# Altium footprint library PCB_Module.PcbLib: 16 footprints
Each footprint in its own frame and in the unit in brackets; x right, y up, seen from the top. Pads: shape width x height; smd on the part's side, far side on the other; paste and mask are expansions set on the pad; w line width, h text height; cw(c..) or ccw(c..) is an arc to the next point about the centre after c.
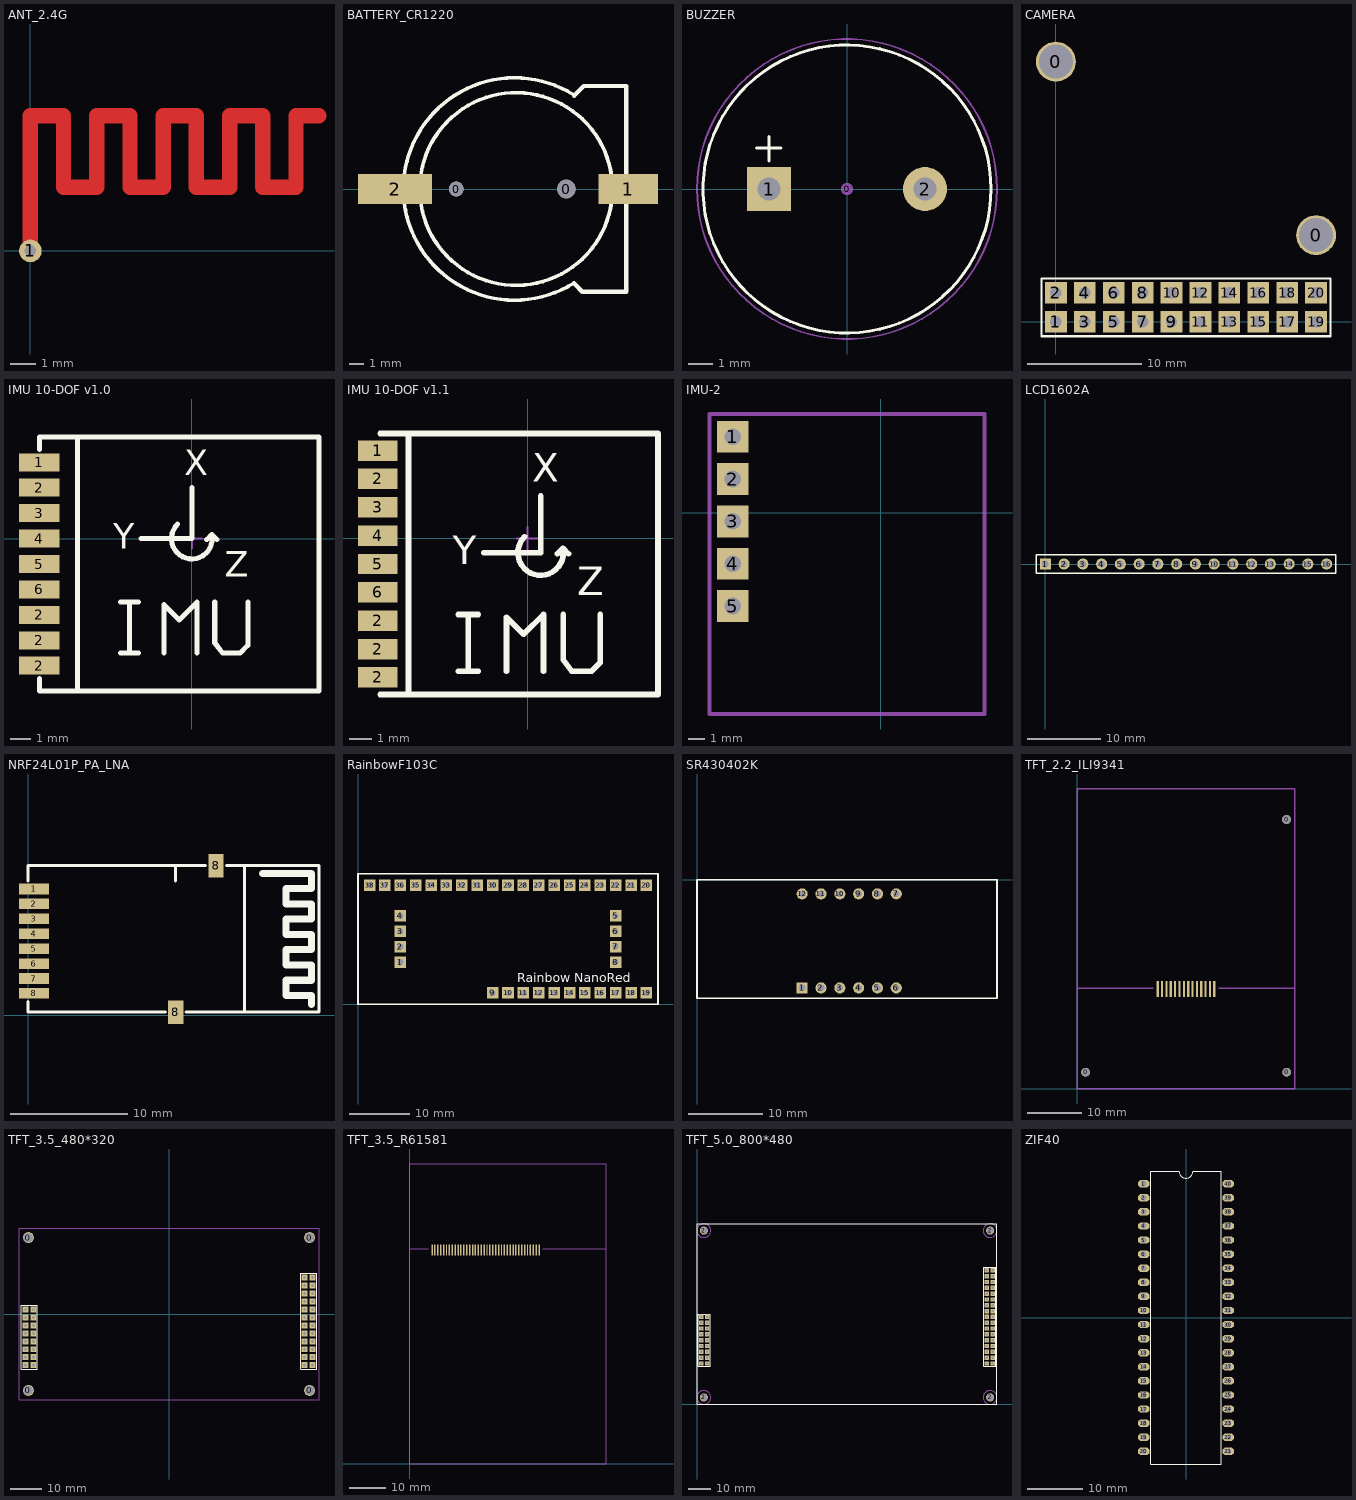
[diagram p0: the footprints below, top view; thin cyan lines are the x and y axes]

## ANT_2.4G [mil]
pads (1):
  round 35 hole 18: 1(0,0)
Top Layer:
  lines w23.62: 0,3.51 0,208.24 51.18,208.24 51.18,98 102.36,98 102.36,208.24 153.54,208.24 153.54,98 204.72,98 204.72,208.24 255.91,208.24 255.91,98 307.09,98 307.09,208.24 358.27,208.24 358.27,98 409.45,98 409.45,208.24 444.88,208.24

## BATTERY_CR1220 [mil]
pads (4):
  round 40 hole 40: 0(342.52,0)
  round 50 hole 50: 0(640,0)
  rect 160x80 smd: 1(807.09,0)
  rect 200x80 smd: 2(177.16,0)
Top Overlay:
  circle w10: c503.94,0 r260.11
  lines w10: 659.93,254.01 ccw(c500,0) 660.14,-253.88
  lines w12: 660.45,251.97 686.52,278.04 801.66,278.04 801.66,0 801.66,-277.07 682.59,-277.07 661.42,-255.91
3D body: height 158.08, standoff -36.4, extent 135.75,-295.69 864.09,294.73

## BUZZER [mil]
height 354.33
pads (3):
  round 20 on Mech14: 0(0,0)
  rect 72x72 / inner rect 72x72 / far side rect 90x90 hole 38: 1(-127.95,0)
  round 72 / inner round 72 / far side round 90 hole 38: 2(127.95,0)
Top Overlay:
  circle w5: c0,0 r236.22
  lines w5: -148.27,66.93 -108.27,66.93 ; -128.02,45.87 -128.02,85.87
Mechanical 13:
  circle w3: c0.14,-0.47 r236.22
Mechanical 14:
  circle w3: c0,0 r246.06
3D body: height 50, standoff 0, extent -172.59,-44.91 -82.95,44.92
3D body: height 50, standoff 0, extent 83.31,-44.9 172.96,44.92
3D body: height 354.33, standoff -110.24, extent -246.02,-246.04 246.07,246.06

## CAMERA [mm] "Connector; Header; 2x2 Position"
height 4.3
pads (22):
  round 3.5 hole 3: 0(0,22.86) 0(22.86,7.62)
  rect 1.905x1.905 hole 1: 1(0,0) 2(0,2.54) 3(2.54,0) 4(2.54,2.54) 5(5.08,0) 6(5.08,2.54) 7(7.62,0) 8(7.62,2.54) 9(10.16,0) 10(10.16,2.54) 11(12.7,0) 12(12.7,2.54) 13(15.24,0) 14(15.24,2.54) 15(17.78,0) 16(17.78,2.54) 17(20.32,0) 18(20.32,2.54) 19(22.86,0) 20(22.86,2.54)
Top Overlay:
  lines w0.2: -1.27,-1.27 24.13,-1.27 24.13,3.81 -1.27,3.81 -1.27,-1.27
3D body: height 8.5, standoff -3.2, extent -1.395,-1.23 3.935,3.77
3D body: height 8.5, standoff -3.2, extent 3.685,-1.23 11.555,3.77
3D body: height 8.5, standoff -3.2, extent 16.385,-1.23 24.255,3.77
3D body: height 8.5, standoff -3.2, extent 11.305,-1.23 16.635,3.77

## IMU 10-DOF v1.0 [mil]
pads (9):
  rect 80x35.43 smd: 1(-300,150) 2(-300,-250) 2(-300,-200) 2(-300,-150) 2(-300,100) 3(-300,50) 4(-300,0) 5(-300,-50) 6(-300,-100)
Top Overlay:
  lines w10: -300,-275 -300,-300 250,-300 250,200 -300,200 -300,175 ; -225,-300 -225,200 ; -140,-225 -105,-225 ; -140,-125 -105,-125 ; -122.5,-225 -122.5,-125 ; -100,0 0,0 0,100 ; -55,-225 -55,-130 -25,-160 10,-125 10,-225 ; -28.28,28.28 ccw(c0,0) 39.22,7.84 ; 29.22,-2.16 39.22,7.84 ; 45,-125 45,-205 60,-225 95,-225 110,-210 110,-125 ; 49.22,-2.16 39.22,7.84
  text "Z" at 65,-75 h50
  text "Y" at -155,-20 h50
  text "X" at -15,125 h50
Mechanical 15:
  lines w3.94: -19.68,0 19.69,0 -19.69,0 ; 0,-19.68 0,19.69 0,-19.69
3D body: height 75.06, standoff 0.6, extent -300,-300 250,200

## IMU 10-DOF v1.1 [mil]
pads (9):
  rect 70x36 smd: 1(-264,155) 2(-264,-245) 2(-264,-195) 2(-264,-145) 2(-264,105) 3(-264,55) 4(-264,5) 5(-264,-45) 6(-264,-95)
Top Overlay:
  lines w10: -260,-275 230,-275 230,185 -260,185 ; -210,-275 -210,185 ; -122,-234 -87,-234 ; -122,-134 -87,-134 ; -104.5,-234 -104.5,-134 ; -77,-25 23,-25 23,75 ; -37,-234 -37,-139 -7,-169 28,-134 28,-234 ; -5.28,3.28 ccw(c23,-25) 62.22,-17.16 ; 52.22,-27.16 62.22,-17.16 ; 63,-134 63,-214 78,-234 113,-234 128,-219 128,-134 ; 72.22,-27.16 62.22,-17.16
  text "Z" at 88,-100 h50
  text "Y" at -132,-45 h50
  text "X" at 8,100 h50
Mechanical 15:
  lines w3.94: -19.69,0 19.68,0 ; 0,-19.69 0,19.68
3D body: height 75.06, standoff 0.6, extent -299.99,-275 230.01,185

## IMU-2 [mil]
pads (5):
  rect 75x75 hole 39.37: 1(-350,180) 2(-350,80) 3(-350,-20) 4(-350,-120) 5(-350,-220)
Mechanical 13:
  lines w10: -405,-475 244.61,-475 244.61,233.66 -405,233.66 -405,-475

## LCD1602A [mm] "LCD1602AҺ"
pads (16):
  rect 1.5x1.5 hole 0.9: 1(0,0)
  round 1.5 hole 0.9: 2(2.54,0) 3(5.08,0) 4(7.62,0) 5(10.16,0) 6(12.7,0) 7(15.24,0) 8(17.78,0) 9(20.32,0) 10(22.86,0) 11(25.4,0) 12(27.94,0) 13(30.48,0) 14(33.02,0) 15(35.56,0) 16(38.1,0)
Top Overlay:
  lines w0.2: -1.27,-1.27 39.37,-1.27 39.37,1.27 0.635,1.27 -1.27,1.27 -1.27,-1.27
3D body: height 21.34, standoff -2.98, extent -8,-34.5 72.5,2

## NRF24L01P_PA_LNA [mm]
pads (10):
  rect 2.54x0.9 smd: 1(0.504,10.734) 2(0.504,9.464) 3(0.504,8.194) 4(0.504,6.924) 5(0.504,5.654) 6(0.504,4.384) 7(0.504,3.114) 8(0.504,1.844)
  rect 1.3x2 smd: 8(12.573,0.254) 8(16.002,12.7)
Top Overlay:
  lines w0.254: 0,1.143 0,0.254 11.684,0.254 ; 0,11.43 0,12.719 15.113,12.719 ; 12.569,11.43 12.569,12.719 ; 13.462,0.254 24.765,0.254 24.765,12.719 16.891,12.719 ; 18.413,0.254 18.413,12.719
  lines w0.6: 19.939,12.065 24.115,12.065 24.115,10.765 21.971,10.765 21.971,9.465 24.115,9.465 24.115,8.165 21.971,8.165 21.971,6.865 24.115,6.865 24.115,5.565 21.971,5.565 21.971,4.265 24.115,4.265 24.115,2.965 21.971,2.965 21.971,1.665 24.115,1.665 24.115,0.889

## RainbowF103C [mm]
pads (38):
  rect 1.905x1.905 hole 1: 1(6.985,6.985) 2(6.985,9.525) 3(6.985,12.065) 4(6.985,14.605) 5(42.545,14.605) 6(42.545,12.065) 7(42.545,9.525) 8(42.545,6.985) 9(22.225,1.905) 10(24.765,1.905) 11(27.305,1.905) 12(29.845,1.905) 13(32.385,1.905) 14(34.925,1.905) 15(37.465,1.905) 16(40.005,1.905) 17(42.545,1.905) 18(45.085,1.905) 19(47.625,1.905) 20(47.625,19.685) 21(45.085,19.685) 22(42.545,19.685) 23(40.005,19.685) 24(37.465,19.685) 25(34.925,19.685) 26(32.385,19.685) 27(29.845,19.685) 28(27.305,19.685) 29(24.765,19.685) 30(22.225,19.685) 31(19.685,19.685) 32(17.145,19.685) 33(14.605,19.685) 34(12.065,19.685) 35(9.525,19.685) 36(6.985,19.685) 37(4.445,19.685) 38(1.905,19.685)
Top Overlay:
  lines w0.254: 0,0 0,21.59 49.53,21.59 49.53,0 0,0
  text "Rainbow NanoRed" at 26.264,3.683 h1.52
3D body: height 4.97, standoff -8.01, extent -2.912,0 52.442,21.59

## SR430402K [mm]
pads (12):
  rect 1.5x1.5 hole 0.9: 1(14.2,-14.6)
  round 1.5 hole 0.9: 2(16.74,-14.6) 3(19.28,-14.6) 4(21.82,-14.6) 5(24.36,-14.6) 6(26.9,-14.6) 7(26.9,-1.9) 8(24.36,-1.9) 9(21.82,-1.9) 10(19.28,-1.9) 11(16.74,-1.9) 12(14.2,-1.9)
Top Overlay:
  lines w0.203: 0,-16 0,0 40.5,0 40.5,-16 0,-16
3D body: height 7, standoff -1.1, extent 0.129,-15.975 40.309,0.025

## TFT_2.2_ILI9341 [mm]
pads (17):
  round 1.6 hole 1.6 unplated: 0(1.575,3.099) 0(38.557,49.581) 0(38.583,3.099)
  rect 0.4x3 smd: 1(14.856,18.39) 2(15.656,18.39) 3(16.456,18.39) 4(17.256,18.39) 5(18.056,18.39) 6(18.856,18.39) 7(19.656,18.39) 8(20.456,18.39) 9(21.256,18.39) 10(22.056,18.39) 11(22.856,18.39) 12(23.656,18.39) 13(24.456,18.39) 14(25.256,18.39)
Mechanical 13:
  lines w0.254: 0,18.5 14.021,18.5 ; 26.035,18.5 40.056,18.5 ; 0,0 0,55.2 40.1,55.2 40.1,0 0,0

## TFT_3.5_480*320 [mm]
pads (44):
  round 3.5 hole 3: 0(-44.772,-24.332) 0(-44.772,24.332) 0(44.772,-24.332) 0(44.772,24.332)
  rect 1.905x1.905 hole 1: 1(43.18,11.632) 2(45.72,11.632) 3(43.18,9.092) 4(45.72,9.092) 5(43.18,6.552) 6(45.72,6.552) 7(43.18,4.012) 8(45.72,4.012) 9(43.18,1.472) 10(45.72,1.472) 11(43.18,-1.068) 12(45.72,-1.068) 13(43.18,-3.608) 14(45.72,-3.608) 15(43.18,-6.148) 16(45.72,-6.148) 17(43.18,-8.688) 18(45.72,-8.688) 19(43.18,-11.228) 20(45.72,-11.228) 21(43.18,-13.768) 22(45.72,-13.768) 23(43.18,-16.308) 24(45.72,-16.308) 25(-45.72,1.472) 26(-43.18,1.472) 27(-45.72,-1.068) 28(-43.18,-1.068) 29(-45.72,-3.608) 30(-43.18,-3.608) 31(-45.72,-6.148) 32(-43.18,-6.148) 33(-45.72,-8.688) 34(-43.18,-8.688) 35(-45.72,-11.228) 36(-43.18,-11.228) 37(-45.72,-13.768) 38(-43.18,-13.768) 39(-45.72,-16.308) 40(-43.18,-16.308)
Top Overlay:
  lines w0.254: -46.99,-17.578 -46.99,2.742 -41.91,2.742 -41.91,-17.578 -46.99,-17.578 ; 41.91,-17.578 46.99,-17.578 46.99,12.902 41.91,12.902 41.91,-17.578
Mechanical 13:
  lines w0.051: -47.772,-27.332 47.772,-27.332 47.772,27.332 -47.772,27.332 -47.772,-27.332
3D body: height 7.58, standoff -2.94, extent -46.99,-17.578 -44.45,-15.038
3D body: height 7.58, standoff -2.94, extent -44.45,-17.578 -41.91,-15.038
3D body: height 7.58, standoff -2.94, extent -44.45,0.202 -41.91,2.742
3D body: height 7.58, standoff -2.94, extent -46.99,0.202 -44.45,2.742
3D body: height 7.58, standoff -2.94, extent -46.99,-2.338 -44.45,0.202
3D body: height 7.58, standoff -2.94, extent -44.45,-2.338 -41.91,0.202
3D body: height 7.58, standoff -2.94, extent -46.99,-4.878 -44.45,-2.338
3D body: height 7.58, standoff -2.94, extent -44.45,-4.878 -41.91,-2.338
3D body: height 7.58, standoff -2.94, extent -46.99,-7.418 -44.45,-4.878
3D body: height 7.58, standoff -2.94, extent -44.45,-7.418 -41.91,-4.878
3D body: height 7.58, standoff -2.94, extent -46.99,-9.958 -44.45,-7.418
3D body: height 7.58, standoff -2.94, extent -44.45,-9.958 -41.91,-7.418
3D body: height 7.58, standoff -2.94, extent -46.99,-12.498 -44.45,-9.958
3D body: height 7.58, standoff -2.94, extent -44.45,-12.498 -41.91,-9.958
3D body: height 7.58, standoff -2.94, extent -46.99,-15.038 -44.45,-12.498
3D body: height 7.58, standoff -2.94, extent -44.45,-15.038 -41.91,-12.498
3D body: height 7.58, standoff -2.94, extent 41.91,7.822 44.45,10.362
3D body: height 7.58, standoff -2.94, extent 44.45,7.822 46.99,10.362
3D body: height 7.58, standoff -2.94, extent 41.91,10.362 44.45,12.902
3D body: height 7.58, standoff -2.94, extent 44.45,10.362 46.99,12.902
3D body: height 7.58, standoff -2.94, extent 41.91,-17.578 44.45,-15.038
3D body: height 7.58, standoff -2.94, extent 44.45,-17.578 46.99,-15.038
3D body: height 7.58, standoff -2.94, extent 41.91,5.282 44.45,7.822
3D body: height 7.58, standoff -2.94, extent 44.45,5.282 46.99,7.822
3D body: height 7.58, standoff -2.94, extent 41.91,2.742 44.45,5.282
3D body: height 7.58, standoff -2.94, extent 44.45,2.742 46.99,5.282
3D body: height 7.58, standoff -2.94, extent 41.91,0.202 44.45,2.742
3D body: height 7.58, standoff -2.94, extent 44.45,0.202 46.99,2.742
3D body: height 7.58, standoff -2.94, extent 41.91,-2.338 44.45,0.202
3D body: height 7.58, standoff -2.94, extent 44.45,-2.338 46.99,0.202
3D body: height 7.58, standoff -2.94, extent 41.91,-4.878 44.45,-2.338
3D body: height 7.58, standoff -2.94, extent 44.45,-4.878 46.99,-2.338
3D body: height 7.58, standoff -2.94, extent 41.91,-7.418 44.45,-4.878
3D body: height 7.58, standoff -2.94, extent 44.45,-7.418 46.99,-4.878
3D body: height 7.58, standoff -2.94, extent 41.91,-9.958 44.45,-7.418
3D body: height 7.58, standoff -2.94, extent 44.45,-9.958 46.99,-7.418
3D body: height 7.58, standoff -2.94, extent 41.91,-12.498 44.45,-9.958
3D body: height 7.58, standoff -2.94, extent 44.45,-12.498 46.99,-9.958
3D body: height 7.58, standoff -2.94, extent 41.91,-15.038 44.45,-12.498
3D body: height 7.58, standoff -2.94, extent 44.45,-15.038 46.99,-12.498

## TFT_3.5_R61581 [mm]
pads (38):
  rect 0.4x3 smd: 1(6.227,59.21) 2(7.027,59.21) 3(7.827,59.21) 4(8.627,59.21) 5(9.427,59.21) 6(10.227,59.21) 7(11.027,59.21) 8(11.827,59.21) 9(12.627,59.21) 10(13.427,59.21) 11(14.227,59.21) 12(15.027,59.21) 13(15.827,59.21) 14(16.627,59.21) 15(17.427,59.21) 16(18.227,59.21) 17(19.027,59.21) 18(19.827,59.21) 19(20.627,59.21) 20(21.427,59.21) 21(22.227,59.21) 22(23.027,59.21) 23(23.827,59.21) 24(24.627,59.21) 25(25.427,59.21) 26(26.227,59.21) 27(27.027,59.21) 28(27.827,59.21) 29(28.627,59.21) 30(29.427,59.21) 31(30.227,59.21) 32(31.027,59.21) 33(31.827,59.21) 34(32.627,59.21) 35(33.427,59.21) 36(34.227,59.21) 37(35.027,59.21) 38(35.827,59.21)
Mechanical 13:
  lines w0.254: 0,59.5 5.24,59.5 ; 36.86,59.5 54.46,59.5 ; 0,0 54.46,0 54.46,82.94 0,82.94 0,0

## TFT_5.0_800*480 [mm]
pads (56):
  rect 1.905x1.905 hole 1: 1(126.365,58.42) 2(128.905,58.42) 3(126.365,55.88) 4(128.905,55.88) 5(126.365,53.34) 6(128.905,53.34) 7(126.365,50.8) 8(128.905,50.8) 9(126.365,48.26) 10(128.905,48.26) 11(126.365,45.72) 12(128.905,45.72) 13(126.365,43.18) 14(128.905,43.18) 15(126.365,40.64) 16(128.905,40.64) 17(126.365,38.1) 18(128.905,38.1) 19(126.365,35.56) 20(128.905,35.56) 21(126.365,33.02) 22(128.905,33.02) 23(126.365,30.48) 24(128.905,30.48) 25(126.365,27.94) 26(128.905,27.94) 27(126.365,25.4) 28(128.905,25.4) 29(126.365,22.86) 30(128.905,22.86) 31(126.365,20.32) 32(128.905,20.32) 33(126.365,17.78) 34(128.905,17.78) 35(1.905,38.1) 36(4.445,38.1) 37(1.905,35.56) 38(4.445,35.56) 39(1.905,33.02) 40(4.445,33.02) 41(1.905,30.48) 42(4.445,30.48) 43(1.905,27.94) 44(4.445,27.94) 45(1.905,25.4) 46(4.445,25.4) 47(1.905,22.86) 48(4.445,22.86) 49(1.905,20.32) 50(4.445,20.32) 51(1.905,17.78) 52(4.445,17.78)
  round 3.5 hole 3: 2(2.997,2.997) 2(2.997,75.743) 2(127.813,2.997) 2(127.813,75.743)
Top Overlay:
  lines w0.2: 0.635,16.51 5.715,16.51 5.715,39.37 0.635,39.37 0.635,16.51 ; 125.095,16.51 130.175,16.51 130.175,59.69 125.095,59.69 125.095,16.51
  lines w0.254: 0,0 0,78.74 130.81,78.74 130.81,0 0,0
Mechanical 13:
  circle w0.025: c127.813,75.743 r3
  circle w0.025: c2.997,75.743 r3
  circle w0.025: c2.997,2.997 r3
  circle w0.025: c127.813,2.997 r3
3D body: height 7.58, standoff -2.94, extent 0.635,16.51 3.175,19.05
3D body: height 7.58, standoff -2.94, extent 3.175,16.51 5.715,19.05
3D body: height 7.58, standoff -2.94, extent 3.175,19.05 5.715,21.59
3D body: height 7.58, standoff -2.94, extent 0.635,19.05 3.175,21.59
3D body: height 7.58, standoff -2.94, extent 3.175,21.59 5.715,24.13
3D body: height 7.58, standoff -2.94, extent 0.635,21.59 3.175,24.13
3D body: height 7.58, standoff -2.94, extent 3.175,24.13 5.715,26.67
3D body: height 7.58, standoff -2.94, extent 0.635,24.13 3.175,26.67
3D body: height 7.58, standoff -2.94, extent 3.175,26.67 5.715,29.21
3D body: height 7.58, standoff -2.94, extent 0.635,26.67 3.175,29.21
3D body: height 7.58, standoff -2.94, extent 3.175,29.21 5.715,31.75
3D body: height 7.58, standoff -2.94, extent 0.635,29.21 3.175,31.75
3D body: height 14.25, standoff 2.55, extent 0,-3.046 130.81,78.74
3D body: height 7.58, standoff -2.94, extent 125.095,16.51 127.635,19.05
3D body: height 7.58, standoff -2.94, extent 125.095,19.05 127.635,21.59
3D body: height 7.58, standoff -2.94, extent 125.095,21.59 127.635,24.13
3D body: height 7.58, standoff -2.94, extent 125.095,24.13 127.635,26.67
3D body: height 7.58, standoff -2.94, extent 125.095,29.21 127.635,31.75
3D body: height 7.58, standoff -2.94, extent 125.095,26.67 127.635,29.21
3D body: height 7.58, standoff -2.94, extent 125.095,31.75 127.635,34.29
3D body: height 7.58, standoff -2.94, extent 125.095,34.29 127.635,36.83
3D body: height 7.58, standoff -2.94, extent 125.095,36.83 127.635,39.37
3D body: height 7.58, standoff -2.94, extent 125.095,39.37 127.635,41.91
3D body: height 7.58, standoff -2.94, extent 125.095,41.91 127.635,44.45
3D body: height 7.58, standoff -2.94, extent 125.095,44.45 127.635,46.99
3D body: height 7.58, standoff -2.94, extent 125.095,46.99 127.635,49.53
3D body: height 7.58, standoff -2.94, extent 125.095,49.53 127.635,52.07
3D body: height 7.58, standoff -2.94, extent 125.095,52.07 127.635,54.61
3D body: height 7.58, standoff -2.94, extent 125.095,54.61 127.635,57.15
3D body: height 7.58, standoff -2.94, extent 125.095,57.15 127.635,59.69
3D body: height 7.58, standoff -2.94, extent 127.635,16.51 130.175,19.05
3D body: height 7.58, standoff -2.94, extent 127.635,19.05 130.175,21.59
3D body: height 7.58, standoff -2.94, extent 127.635,21.59 130.175,24.13
3D body: height 7.58, standoff -2.94, extent 127.635,24.13 130.175,26.67
3D body: height 7.58, standoff -2.94, extent 127.635,29.21 130.175,31.75
3D body: height 7.58, standoff -2.94, extent 127.635,26.67 130.175,29.21
3D body: height 7.58, standoff -2.94, extent 127.635,31.75 130.175,34.29
3D body: height 7.58, standoff -2.94, extent 127.635,34.29 130.175,36.83
3D body: height 7.58, standoff -2.94, extent 127.635,36.83 130.175,39.37
3D body: height 7.58, standoff -2.94, extent 127.635,39.37 130.175,41.91
3D body: height 7.58, standoff -2.94, extent 127.635,41.91 130.175,44.45
3D body: height 7.58, standoff -2.94, extent 127.635,44.45 130.175,46.99
3D body: height 7.58, standoff -2.94, extent 127.635,46.99 130.175,49.53
3D body: height 7.58, standoff -2.94, extent 127.635,49.53 130.175,52.07
3D body: height 7.58, standoff -2.94, extent 127.635,52.07 130.175,54.61
3D body: height 7.58, standoff -2.94, extent 127.635,54.61 130.175,57.15
3D body: height 7.58, standoff -2.94, extent 127.635,57.15 130.175,59.69
3D body: height 7.58, standoff -2.94, extent 0.635,31.75 3.175,34.29
3D body: height 7.58, standoff -2.94, extent 0.635,34.29 3.175,36.83
3D body: height 7.58, standoff -2.94, extent 0.635,36.83 3.175,39.37
3D body: height 7.58, standoff -2.94, extent 3.175,31.75 5.715,34.29
3D body: height 7.58, standoff -2.94, extent 3.175,34.29 5.715,36.83
3D body: height 7.58, standoff -2.94, extent 3.175,36.83 5.715,39.37

## ZIF40 [mil]
pads (40):
  oct 80x52 hole 39.37: 1(-300,950) 2(-300,850) 3(-300,750) 4(-300,650) 5(-300,550) 6(-300,450) 7(-300,350) 8(-300,250) 9(-300,150) 10(-300,50) 11(-300,-50) 12(-300,-150) 13(-300,-250) 14(-300,-350) 15(-300,-450) 16(-300,-550) 17(-300,-650) 18(-300,-750) 19(-300,-850) 20(-300,-950) 21(300,-950) 22(300,-850) 23(300,-750) 24(300,-650) 25(300,-550) 26(300,-450) 27(300,-350) 28(300,-250) 29(300,-150) 30(300,-50) 31(300,50) 32(300,150) 33(300,250) 34(300,350) 35(300,450) 36(300,550) 37(300,650) 38(300,750) 39(300,850) 40(300,950)
Top Overlay:
  lines w6: -250,-1040 250,-1040 250,1040 50,1040 cw(c0,1040) -50,1040 -250,1040 -250,-1040
3D body: height 146.85, standoff -483.07, extent -487.3,-1195.01 452.3,1844.02